# Altium footprint library Transformers.PcbLib: 102 footprints (part 4 of 7)
Each footprint in its own frame and in the unit in brackets; x right, y up, seen from the top. Pads: shape width x height; smd on the part's side, far side on the other; paste and mask are expansions set on the pad; w line width, h text height; cw(c..) or ccw(c..) is an arc to the next point about the centre after c.
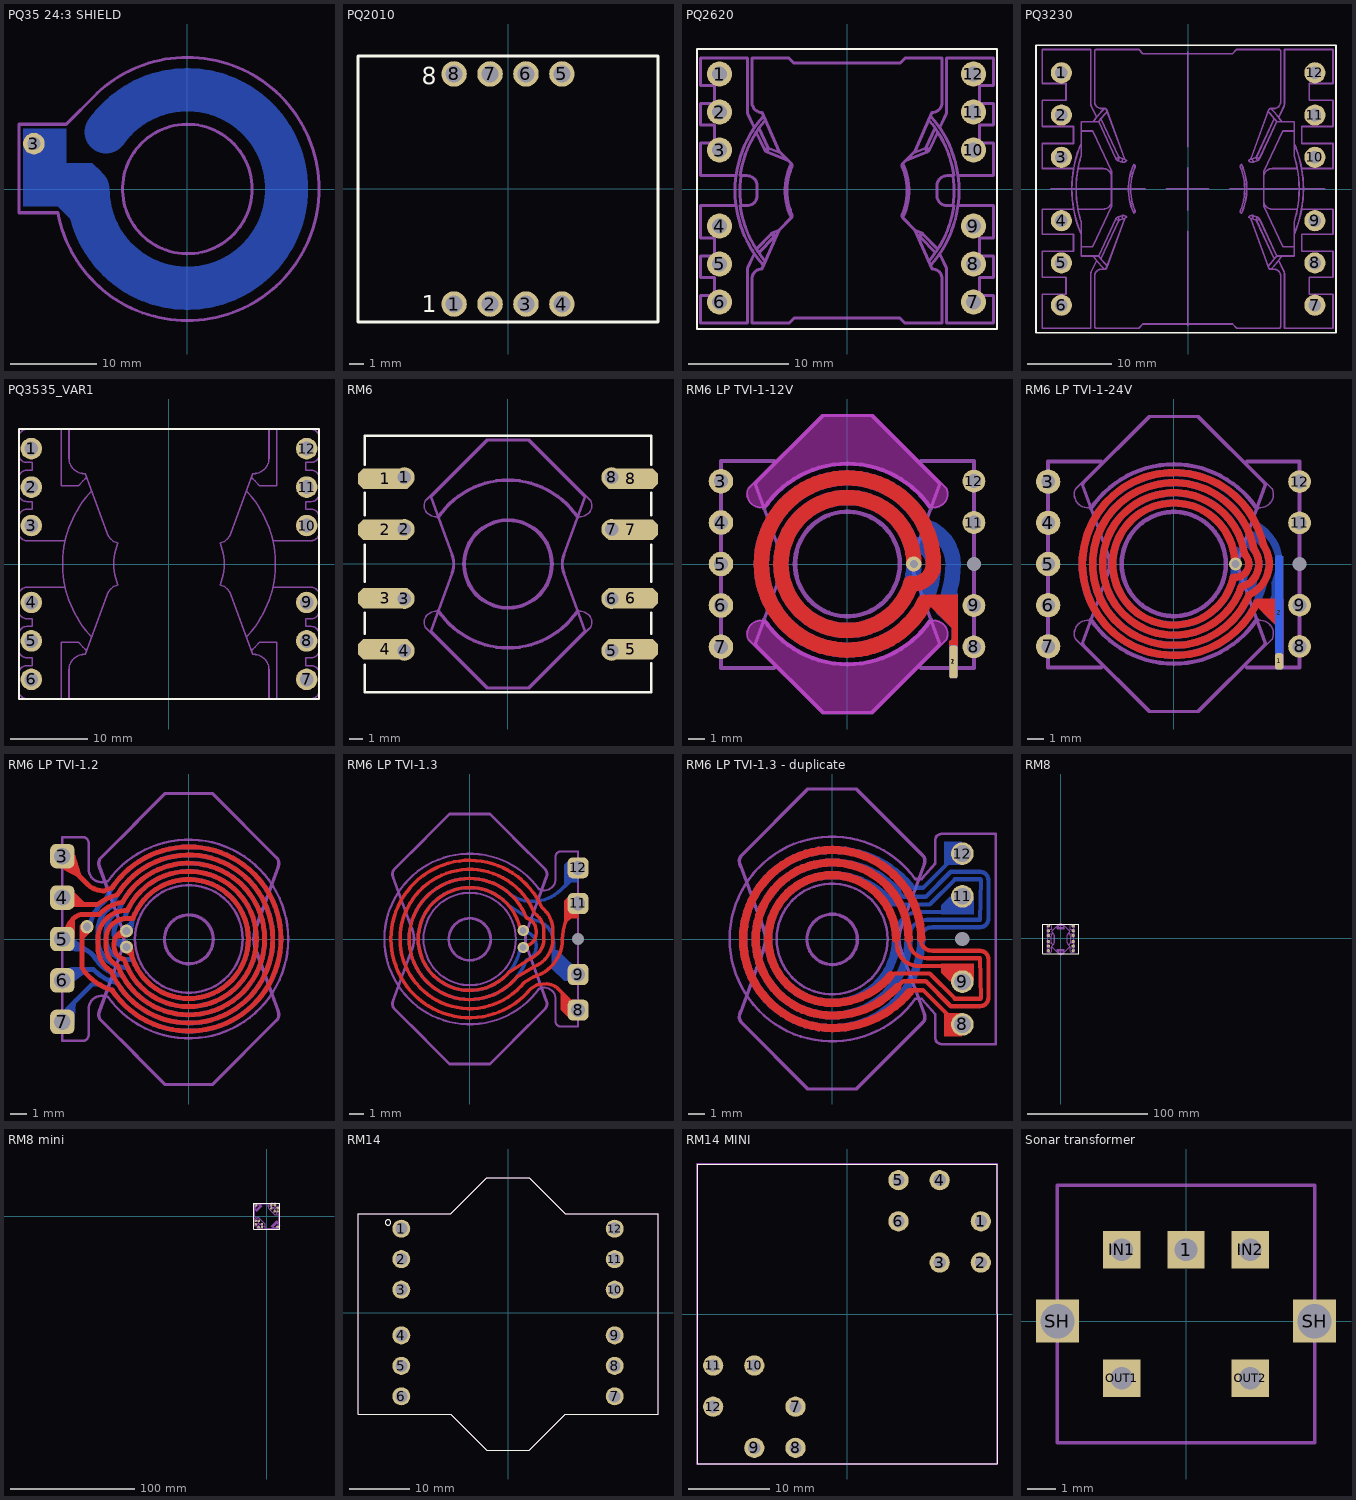
[diagram p3: the footprints below, top view; thin cyan lines are the x and y axes]

## PQ35 24:3 SHIELD [mm]
pads (1):
  round 2.5 hole 1.5: 3(-17.773,5.252)
Bottom Layer:
  region: -19,7 -19,-2 -15,-2 -10,-7 -10,-1 -10,2 -11,3 -14,3 -14,7
  lines w5: -11.5,0 ccw(c0,0) 0,-11.5 ccw(c0,0) 11.5,0 ccw(c0,0) -9.421,6.595
Mechanical 2:
  circle w0.35: c0,0 r7.5
  lines w0.35: -10.53,11 -14.03,7.5 -17,7.5 -19.5,7.5 -19.5,-2.75 -15,-2.75 ccw(c0,0) 0,-15.25 ccw(c0,0) 15.25,0 ccw(c0,0) 0,15.25 ccw(c0,0) -10.53,11.031

## PQ2010 [mm]
pads (8):
  round 1.8 hole 1.2 paste-25.4: 1(-3.81,-8.128) 2(-1.27,-8.128) 3(1.27,-8.128) 4(3.81,-8.128) 5(3.81,8.128) 6(1.27,8.128) 7(-1.27,8.128) 8(-3.81,8.128)
Top Overlay:
  lines w0.2: -10.6,-9.4 -10.6,9.4 10.6,9.4 10.6,-9.4 -10.6,-9.4
  text "1" at -6.1,-8.7 h1.2
  text "8" at -6.1,7.4 h1.2
Top Assembly:
  lines w0.1: -10.6,-9.4 -10.6,9.4 10.6,9.4 10.6,-9.4 -10.6,-9.4
  text "1" at -6.1,-8.7 h1
  text "8" at -6.1,7.4 h1
3D body "PQ2010_TRANSFORMER.step": height 9.5, standoff -2.9, extent -10.6,-9.398 10.6,9.398

## PQ2620 [mm]
pads (12):
  round 2.5 hole 1.5 paste-25.4: 1(-12.75,11.5) 2(-12.75,7.7) 3(-12.75,3.9) 4(-12.75,-3.7) 5(-12.75,-7.5) 6(-12.75,-11.3) 7(12.65,-11.3) 8(12.65,-7.5) 9(12.65,-3.7) 10(12.65,3.9) 11(12.65,7.7) 12(12.65,11.5)
Top Overlay:
  lines w0.2: -15,-14 -15,14 15,14 15,-14 -15,-14
Top Assembly:
  lines w0.3: -11.095,-1.667 -14.646,-1.667 -14.646,-4.917 -13.246,-4.917 -13.246,-6.717 -14.646,-6.717 -14.646,-8.867 -13.246,-8.867 -13.246,-10.667 -14.646,-10.667 -14.646,-13.417 -9.946,-13.417 -9.946,-8.028 cw(c-9.446,-8.028) -9.899,-7.817 -9.265,-6.455 ; -11.095,1.333 -14.646,1.333 -14.646,4.583 -13.246,4.583 -13.246,6.383 -14.646,6.383 -14.646,8.533 -13.246,8.533 -13.246,10.333 -14.646,10.333 -14.646,13.083 -9.946,13.083 -9.946,7.694 ccw(c-9.446,7.694) -9.899,7.482 -9.265,6.121 ; -10.591,-1.667 cw(c-0.043,-0.167) -10.591,1.333 ; -8.342,-7.636 cw(c0.004,-0.167) -8.342,7.302 ; -8.164,-7.233 cw(c0.004,-0.167) -8.838,-6.369 ; -8.164,6.898 ccw(c0.004,-0.167) -8.805,6.082 ; -7.037,-4.665 -7.249,-4.743 ; -6.815,-4.159 -7.386,-4.367 ; -6.582,3.569 -7.842,4.08 ; -5.856,2.843 -7.992,3.709 ; -5.57,-2.883 cw(c0.004,-0.167) -5.57,2.549 ; 5.577,-2.883 ccw(c0.004,-0.167) 5.577,2.549 ; 5.864,2.843 8,3.709 ; 6.59,3.569 7.849,4.08 ; 6.822,-4.159 7.393,-4.367 ; 7.045,-4.665 7.257,-4.743 ; 8.172,-7.233 ccw(c0.004,-0.167) 8.845,-6.369 ; 8.172,6.898 cw(c0.004,-0.167) 8.812,6.082 ; 8.349,-7.636 ccw(c0.004,-0.167) 8.349,7.302 ; 9.272,-6.455 9.907,-7.817 cw(c9.454,-8.028) 9.954,-8.028 9.954,-13.417 14.654,-13.417 14.654,-10.667 13.254,-10.667 13.254,-8.867 14.654,-8.867 14.654,-6.717 13.254,-6.717 13.254,-4.917 14.654,-4.917 14.654,-1.667 11.103,-1.667 ; 9.272,6.121 9.907,7.482 ccw(c9.454,7.694) 9.954,7.694 9.954,13.083 14.654,13.083 14.654,10.333 13.254,10.333 13.254,8.533 14.654,8.533 14.654,6.383 13.254,6.383 13.254,4.583 14.654,4.583 14.654,1.333 11.103,1.333 ; 10.598,-1.667 ccw(c0.051,-0.167) 10.598,1.333 ; -9.066,-6.03 ccw(c0.004,-0.167) -8.838,-6.369 ; -9.066,-6.03 cw(c0.004,-0.167) -10.692,-1.667 -9.996,-1.667 ccw(c-9.996,-0.667) -8.996,-0.667 -8.996,0.333 ccw(c-9.996,0.333) -9.996,1.333 -10.692,1.333 cw(c0.004,-0.167) -9.066,5.696 ; -9.066,-6.03 -7.574,-4.489 ; -9.066,5.696 cw(c0.004,-0.167) -8.805,6.082 ; -9.066,5.696 -8.257,3.961 ; -8.838,-6.369 -7.287,-4.767 ; -8.805,6.082 -7.895,4.13 ; -8.257,3.961 ccw(c-7.804,4.172) -7.992,3.709 ; -8.257,3.961 -7.895,4.13 ; -7.992,3.709 -7.842,4.08 ; -7.895,4.13 -7.873,4.1 -7.842,4.08 ; -7.574,-4.489 cw(c-7.215,-4.837) -7.386,-4.367 ; -7.574,-4.489 -7.287,-4.767 ; -7.386,-4.367 -7.249,-4.743 ; -7.287,-4.767 cw(c-7.215,-4.837) -7.249,-4.743 ; 7.257,-4.743 cw(c7.222,-4.837) 7.294,-4.767 ; 7.257,-4.743 7.393,-4.367 ; 7.294,-4.767 8.845,-6.369 ; 7.294,-4.767 7.582,-4.489 ; 7.393,-4.367 cw(c7.222,-4.837) 7.582,-4.489 ; 7.582,-4.489 9.074,-6.03 ; 7.849,4.08 8,3.709 ; 7.849,4.08 7.881,4.1 7.902,4.13 ; 7.902,4.13 8.812,6.082 ; 7.902,4.13 8.265,3.961 ; 8,3.709 ccw(c7.812,4.172) 8.265,3.961 ; 8.265,3.961 9.074,5.696 ; 8.812,6.082 cw(c0.004,-0.167) 9.074,5.696 ; 8.845,-6.369 ccw(c0.004,-0.167) 9.074,-6.03 ; 9.074,-6.03 ccw(c0.004,-0.167) 10.699,-1.667 10.004,-1.667 cw(c10.004,-0.667) 9.004,-0.667 9.004,0.333 cw(c10.004,0.333) 10.004,1.333 10.699,1.333 ccw(c0.004,-0.167) 9.074,5.696 ; -9.496,-13.417 -9.496,-8.988 cw(c-8.496,-8.988) -8.496,-7.988 -6.796,-4.117 -5.612,-2.933 ccw(c-5.895,-2.65) -5.526,-2.495 cw(c0.004,-0.167) -5.526,2.161 ccw(c-5.895,2.316) -5.612,2.599 -6.796,3.783 -8.496,7.654 cw(c-8.496,8.654) -9.496,8.654 -9.496,13.083 -5.796,13.083 -5.296,12.583 5.304,12.583 5.804,13.083 9.504,13.083 9.504,8.654 cw(c8.504,8.654) 8.504,7.654 6.804,3.783 5.62,2.599 ccw(c5.902,2.316) 5.534,2.161 cw(c0.004,-0.167) 5.534,-2.495 ccw(c5.902,-2.65) 5.62,-2.933 6.804,-4.117 8.504,-7.988 cw(c8.504,-8.988) 9.504,-8.988 9.504,-13.417 5.804,-13.417 5.304,-12.917 -5.296,-12.917 -5.796,-13.417 -9.496,-13.417
  text "1" at -12,11 h1.52
  text "12" at 11,11 h1.52
3D body "User Library-PQ 26_20.step": height 25.43, standoff -3.6, extent -14.65,-13.25 14.65,13.25

## PQ3230 [mm]
pads (12):
  round 2.5 hole 1.5 paste-25.4: 1(-15,13.75) 2(-15,8.75) 3(-15,3.75) 4(-15,-3.75) 5(-15,-8.75) 6(-15,-13.75) 7(15,-13.75) 8(15,-8.75) 9(15,-3.75) 10(15,3.75) 11(15,8.75) 12(15,13.75)
Top Overlay:
  lines w0.2: -18,-17 -18,17 17.5,17 17.5,-16.5 17.5,-17 -18,-17
Top Assembly:
  drawing of 220 lines, arcs and shapes, not listed
3D body "User Library-PQ 32_30.step": height 35.9, standoff -1.9, extent -17.2,-16.5 17.2,16.5

## PQ3535_VAR1 [mm]
pads (12):
  round 2.8 hole 1.8: 1(-17.9,15) 2(-17.9,10) 3(-17.9,5) 4(-17.9,-5) 5(-17.9,-10) 6(-17.9,-15) 7(17.9,-15) 8(17.9,-10) 9(17.9,-5) 10(17.9,5) 11(17.9,10) 12(17.9,15)
Top Overlay:
  lines w0.2: -19.5,-17.55 19.5,-17.55 19.5,17.55 -19.5,17.55 -19.5,-17.55
Top Assembly:
  lines w0.2: -13.5,-3.04 -18.5,-3.04 ccw(c-18.5,-4.04) -19.5,-4.04 -19.5,-6.12 ccw(c-18.5,-6.12) -18.5,-7.12 -17.78,-7.12 -17.78,-8.12 -18.5,-8.12 ccw(c-18.5,-9.12) -19.5,-9.12 -19.5,-11.2 ccw(c-18.5,-11.2) -18.5,-12.2 -17.78,-12.2 -17.78,-13.2 -18.5,-13.2 ccw(c-18.5,-14.2) -19.5,-14.2 -19.5,-16.5 ccw(c-18.5,-16.5) -18.5,-17.5 -14,-17.5 -14,-10.16 -11.772,-10.16 -11.191,-10.796 -10.693,-11.29 ; -13.5,3.04 -18.5,3.04 cw(c-18.5,4.04) -19.5,4.04 -19.5,6.12 cw(c-18.5,6.12) -18.5,7.12 -17.78,7.12 -17.78,8.12 -18.5,8.12 cw(c-18.5,9.12) -19.5,9.12 -19.5,11.2 cw(c-18.5,11.2) -18.5,12.2 -17.78,12.2 -17.78,13.2 -18.5,13.2 cw(c-18.5,14.2) -19.5,14.2 -19.5,16.5 cw(c-18.5,16.5) -18.5,17.5 -14,17.5 -14,10.16 -11.772,10.16 -11.191,10.796 -10.693,11.29 ; -10.047,-9.516 cw(c0,0) -10.047,9.516 ; 10.047,-9.516 ccw(c0,0) 10.047,9.516 ; 10.693,-11.29 11.191,-10.796 11.772,-10.16 14,-10.16 14,-17.5 18.5,-17.5 ccw(c18.5,-16.5) 19.5,-16.5 19.5,-14.2 ccw(c18.5,-14.2) 18.5,-13.2 17.78,-13.2 17.78,-12.2 18.5,-12.2 ccw(c18.5,-11.2) 19.5,-11.2 19.5,-9.12 ccw(c18.5,-9.12) 18.5,-8.12 17.78,-8.12 17.78,-7.12 18.5,-7.12 ccw(c18.5,-6.12) 19.5,-6.12 19.5,-4.04 ccw(c18.5,-4.04) 18.5,-3.04 13.5,-3.04 ; 10.693,11.29 11.191,10.796 11.772,10.16 14,10.16 14,17.5 18.5,17.5 cw(c18.5,16.5) 19.5,16.5 19.5,14.2 cw(c18.5,14.2) 18.5,13.2 17.78,13.2 17.78,12.2 18.5,12.2 cw(c18.5,11.2) 19.5,11.2 19.5,9.12 cw(c18.5,9.12) 18.5,8.12 17.78,8.12 17.78,7.12 18.5,7.12 cw(c18.5,6.12) 19.5,6.12 19.5,4.04 cw(c18.5,4.04) 18.5,3.04 13.5,3.04 ; -13,-17.55 13,-17.55 13,-13.75 ccw(c11,-13.75) 11,-11.75 10.86,-11.75 8.032,-3.981 ccw(c6.153,-4.665) 6.907,-2.813 6.645,-2.706 ccw(c0,0) 6.645,2.706 6.907,2.813 ccw(c6.153,4.665) 8.032,3.981 10.86,11.75 11,11.75 ccw(c11,13.75) 13,13.75 13,17.55 -13,17.55 -13,13.75 ccw(c-11,13.75) -11,11.75 -10.86,11.75 -8.032,3.981 ccw(c-6.153,4.665) -6.907,2.813 -6.645,2.706 ccw(c0,0) -6.645,-2.706 -6.907,-2.813 ccw(c-6.153,-4.665) -8.032,-3.981 -10.86,-11.75 -11,-11.75 ccw(c-11,-13.75) -13,-13.75 -13,-17.55
  text "1" at -15.5,13.596 h1
  text "6" at -15.5,-15 h1
  text "7" at 15,-15 h1
  text "12" at 14.5,13.596 h1
3D body "User Library-PQ3535(6+6).STEP": height 38.05, standoff -3.7, extent -19.5,-17.75 19.5,17.75

## RM6 [mm]
pads (16):
  oct 4x1.5 smd: 1(-9,6.25) 2(-9,2.5) 3(-9,-2.5) 4(-9,-6.25) 5(9,-6.25) 6(9,-2.5) 7(9,2.5) 8(9,6.25)
  round 1.5 hole 1: 1(-7.6,6.35) 2(-7.6,2.54) 3(-7.6,-2.54) 4(-7.6,-6.35) 5(7.6,-6.35) 6(7.6,-2.54) 7(7.6,2.54) 8(7.6,6.35)
Top Overlay:
  lines w0.2: -10.5,-7.4 -10.5,-9.4 10.5,-9.4 10.5,-7.3 ; -10.5,-5.1 -10.5,-3.6 ; -10.5,-1.3 -10.5,1.4 ; -10.5,3.6 -10.5,5.2 ; -10.5,7.3 -10.5,9.4 10.5,9.4 10.5,7.3 ; 10.5,-5.1 10.5,-3.6 ; 10.5,-1.3 10.5,1.4 ; 10.5,3.6 10.5,5.2
Mechanical 2:
  circle w0.102: c0,0 r3.302
  lines w0.102: -6.057,-4.651 cw(c-5.329,-4.289) -4.978,-3.556 ; -6.057,4.651 ccw(c-5.329,4.289) -4.978,3.556 ; -6.05,-4.643 -1.549,-9.144 1.549,-9.144 6.05,-4.643 ; -6.05,4.643 -1.549,9.144 1.549,9.144 6.05,4.643 ; -5.931,4.763 -1.57,9.124 ; -4.96,-3.543 ccw(c0,0) 4.961,-3.543 ; -4.961,3.543 cw(c0,0) 4.961,3.543 ; 1.57,-9.124 5.931,-4.763 ; 4.978,-3.556 cw(c5.329,-4.289) 6.057,-4.651 ; 4.978,3.556 ccw(c5.329,4.289) 6.057,4.651
Top Assembly:
  circle w0.254: c0,0 r3.2
  lines w0.2: -5.635,-4.871 -4.103,-0.661 ; -5.577,-4.996 -1.486,-9.086 ; -1.486,-9.1 1.486,-9.1 ; -1.486,9.086 -5.577,4.996 -5.635,4.871 -4.103,0.661 ; -1.486,9.1 1.486,9.1 ; 1.486,-9.086 5.577,-4.996 ; 1.486,9.086 5.577,4.996 ; -4.103,-0.707 ccw(c-5.982,-0.023) -4.103,0.661 ; -4.103,-0.707 ccw(c-5.982,-0.023) -4.103,0.661 ; -4.103,-0.707 ccw(c-5.982,-0.023) -4.103,0.661 ; -4.103,-0.707 ccw(c-5.982,-0.023) -4.103,0.661 ; -4.103,-0.661 ccw(c-5.982,0.023) -4.103,0.707 ; -4.103,-0.661 ccw(c-5.982,0.023) -4.103,0.707 ; -4.103,-0.661 ccw(c-5.982,0.023) -4.103,0.707 ; -4.103,-0.661 ccw(c-5.982,0.023) -4.103,0.707 ; 4.103,-0.707 cw(c5.982,-0.023) 4.103,0.661 ; 4.103,-0.707 cw(c5.982,-0.023) 4.103,0.661 ; 4.103,-0.707 cw(c5.982,-0.023) 4.103,0.661 ; 4.103,-0.707 cw(c5.982,-0.023) 4.103,0.661 ; 4.103,-0.661 cw(c5.982,0.023) 4.103,0.707 ; 4.103,-0.661 cw(c5.982,0.023) 4.103,0.707 ; 4.103,-0.661 cw(c5.982,0.023) 4.103,0.707 ; 4.103,-0.661 cw(c5.982,0.023) 4.103,0.707 ; 4.103,-0.661 5.635,-4.871 ; 4.103,-0.661 5.49,-4.471 4.103,-0.661 ; 4.103,0.661 5.49,4.471 4.103,0.661 ; 4.103,0.661 5.635,4.871 ; 5.577,-4.996 5.635,-4.871 ; 5.577,-4.996 5.635,-4.871 ; 5.577,4.996 5.635,4.871 ; 5.577,4.996 5.635,4.871
  lines w0.254: -5.117,-3.411 ccw(c0,0) 5.117,-3.412 ; -5.117,3.411 cw(c0,0) 5.117,3.412
3D body "RM6.STEP": height 13.13, standoff 0, extent -10.5,-9.406 10.5,9.406

## RM6 LP TVI-1-12V [mm]
pads (12):
  rrect50% 0.5x2 smd: 1(6.5,-6)
  rrect50% 0.5x2 smd far side: 2(6.5,-6)
  round 1.5 hole 0.85: 3(-7.75,5.08) 4(-7.75,2.54) 5(-7.75,0) 6(-7.75,-2.54) 7(-7.75,-5.08)
  round 1.4 hole 0.85: 8(7.75,-5.08) 9(7.75,-2.54) 11(7.75,2.54) 12(7.75,5.08)
  round 0 hole 0.85: 10(7.75,0)
via 4.075,0 diameter 0.95 hole 0.5
Top Layer:
  region: 6.4,-3.9 4.65,-2.15 4.9,-1.9 6.75,-1.9 6.75,-3 6.75,-3.7 6.75,-4.5 6.75,-5.4 6.5,-5.4 6.25,-5.5 6.25,-4.75 6.4,-4.6
  lines w0.254: 4.75,-2.25 5.293,-2.25 cw(c5.293,-3.957) 6.5,-2.75 6.5,-6
  lines w0.95: 3.898,-1.188 cw(c0,0) -4.075,0 cw(c0,0) 0,4.075 cw(c0,0) 4.075,0 ; 3.898,-1.187 ccw(c4.075,0) 5.275,0 ccw(c0,0) 0,5.275 ccw(c0,0) -5.275,0 ccw(c0,0) 4.718,-2.359
Bottom Layer:
  region: 6.25,-3.8 5.475,-3.025 6.75,-1.75 6.75,-5.5 6.25,-5.5 6.25,-4.75 6.4,-4.6 6.4,-3.95
  lines w0.95: 3.898,1.187 cw(c4.075,0) 5.275,0 cw(c0,0) 0,-5.275 cw(c0,0) -5.275,0 cw(c0,0) 4.718,2.359 ; 3.898,1.188 ccw(c0,0) -4.075,0 ccw(c0,0) 0,-4.075 ccw(c0,0) 4.075,0 ; 4.713,2.314 cw(c4.075,0) 6.475,0 cw(c0,0) 5.85,-2.776
Keep-Out Layer:
  drawing of 2 lines, arcs and shapes, not listed
Mechanical 2:
  circle w0.102: c0,0 r3.302
  lines w0.102: -6.057,-4.651 cw(c-5.329,-4.289) -4.978,-3.556 ; -6.057,4.651 ccw(c-5.329,4.289) -4.978,3.556 ; -6.05,-4.643 -1.549,-9.144 1.549,-9.144 6.05,-4.643 ; -6.05,4.643 -1.549,9.144 1.549,9.144 6.05,4.643 ; -5.931,4.763 -1.57,9.124 ; -4.96,-3.543 ccw(c0,0) 4.961,-3.543 ; -4.961,3.543 cw(c0,0) 4.96,3.543 ; 1.57,-9.124 5.931,-4.763 ; 4.978,-3.556 cw(c5.329,-4.289) 6.057,-4.651 ; 4.978,3.556 ccw(c5.329,4.289) 6.057,4.651
Top Assembly:
  circle w0.254: c0,0 r3.2
  lines w0.2: -1.486,-9.1 1.486,-9.1 ; -1.486,-9.086 -5.577,-4.996 -5.635,-4.871 -4.103,-0.661 ; -1.486,9.086 -5.577,4.996 -5.635,4.871 -4.103,0.661 ; -1.486,9.1 1.486,9.1 ; 1.486,-9.086 5.577,-4.996 ; 1.486,9.086 5.577,4.996 ; -4.103,-0.707 ccw(c-5.982,-0.023) -4.103,0.661 ; -4.103,-0.707 ccw(c-5.982,-0.023) -4.103,0.661 ; -4.103,-0.707 ccw(c-5.982,-0.023) -4.103,0.661 ; -4.103,-0.707 ccw(c-5.982,-0.023) -4.103,0.661 ; -4.103,-0.661 ccw(c-5.982,0.023) -4.103,0.707 ; -4.103,-0.661 ccw(c-5.982,0.023) -4.103,0.707 ; -4.103,-0.661 ccw(c-5.982,0.023) -4.103,0.707 ; -4.103,-0.661 ccw(c-5.982,0.023) -4.103,0.707 ; 4.103,-0.707 cw(c5.982,-0.023) 4.103,0.661 ; 4.103,-0.707 cw(c5.982,-0.023) 4.103,0.661 ; 4.103,-0.707 cw(c5.982,-0.023) 4.103,0.661 ; 4.103,-0.707 cw(c5.982,-0.023) 4.103,0.661 ; 4.103,-0.661 cw(c5.982,0.023) 4.103,0.707 ; 4.103,-0.661 cw(c5.982,0.023) 4.103,0.707 ; 4.103,-0.661 cw(c5.982,0.023) 4.103,0.707 ; 4.103,-0.661 cw(c5.982,0.023) 4.103,0.707 ; 4.103,-0.661 5.49,-4.471 4.103,-0.661 ; 4.103,-0.661 5.635,-4.871 ; 4.103,0.661 5.635,4.871 ; 4.103,0.661 5.49,4.471 4.103,0.661 ; 5.577,-4.996 5.635,-4.871 ; 5.577,-4.996 5.635,-4.871 ; 5.577,4.996 5.635,4.871 ; 5.577,4.996 5.635,4.871
  lines w0.25: -4.5,-6.375 -7.75,-6.375 -7.75,6.323 -4.5,6.323 ; 4.5,-6.375 7.75,-6.375 7.75,6.323 4.5,6.323
  lines w0.254: -5.117,-3.411 ccw(c0,0) 5.117,-3.412 ; -5.117,3.411 cw(c0,0) 5.117,3.412
3D body "User Library-rm_6.step": height 4, standoff -0.5, extent -5.235,-8.9 5.235,9
3D body "User Library-rm_6.step": height 4, standoff -0.5, extent -5.235,-8.9 5.235,9

## RM6 LP TVI-1-24V [mm]
pads (12):
  rrect50% 0.5x1 smd: 1(6.5,-6)
  rrect50% 0.5x7 smd far side: 2(6.5,-3)
  round 1.5 hole 0.85: 3(-7.75,5.08) 4(-7.75,2.54) 5(-7.75,0) 6(-7.75,-2.54) 7(-7.75,-5.08)
  round 1.4 hole 0.85: 8(7.75,-5.08) 9(7.75,-2.54) 11(7.75,2.54) 12(7.75,5.08)
  round 0 hole 0.85: 10(7.75,0)
via 3.8,0 diameter 0.8 hole 0.5
Top Layer:
  region: 605 vertices and 0 holes, not listed, extent -5.85,-5.853 6.088,5.85
  region: 6.4,-3.9 4.888,-2.387 5.125,-2.15 6.75,-2.15 6.75,-3 6.75,-3.7 6.75,-4.5 6.75,-6 6.25,-6 6.25,-4.75 6.4,-4.6
Bottom Layer:
  region: 576 vertices and 0 holes, not listed, extent -5.85,-5.85 6.713,5.852
  region: 5.492,-2.992 6.025,-1.951 6.025,-1.15 6.3,-1.15 6.3,-3.8
Mechanical 2:
  circle w0.102: c0,0 r3.302
  lines w0.102: -6.057,-4.651 cw(c-5.329,-4.289) -4.978,-3.556 ; -6.057,4.651 ccw(c-5.329,4.289) -4.978,3.556 ; -6.05,-4.643 -1.549,-9.144 1.549,-9.144 6.05,-4.643 ; -6.05,4.643 -1.549,9.144 1.549,9.144 6.05,4.643 ; -5.931,4.763 -1.57,9.124 ; -4.96,-3.543 ccw(c0,0) 4.961,-3.543 ; -4.961,3.543 cw(c0,0) 4.96,3.543 ; 1.57,-9.124 5.931,-4.763 ; 4.978,-3.556 cw(c5.329,-4.289) 6.057,-4.651 ; 4.978,3.556 ccw(c5.329,4.289) 6.057,4.651
Top Assembly:
  circle w0.254: c0,0 r3.2
  lines w0.2: -1.486,-9.1 1.486,-9.1 ; -1.486,-9.086 -5.577,-4.996 -5.635,-4.871 -4.103,-0.661 ; -1.486,9.086 -5.577,4.996 -5.635,4.871 -4.103,0.661 ; -1.486,9.1 1.486,9.1 ; 1.486,-9.086 5.577,-4.996 ; 1.486,9.086 5.577,4.996 ; -4.103,-0.707 ccw(c-5.982,-0.023) -4.103,0.661 ; -4.103,-0.707 ccw(c-5.982,-0.023) -4.103,0.661 ; -4.103,-0.707 ccw(c-5.982,-0.023) -4.103,0.661 ; -4.103,-0.707 ccw(c-5.982,-0.023) -4.103,0.661 ; -4.103,-0.661 ccw(c-5.982,0.023) -4.103,0.707 ; -4.103,-0.661 ccw(c-5.982,0.023) -4.103,0.707 ; -4.103,-0.661 ccw(c-5.982,0.023) -4.103,0.707 ; -4.103,-0.661 ccw(c-5.982,0.023) -4.103,0.707 ; 4.103,-0.707 cw(c5.982,-0.023) 4.103,0.661 ; 4.103,-0.707 cw(c5.982,-0.023) 4.103,0.661 ; 4.103,-0.707 cw(c5.982,-0.023) 4.103,0.661 ; 4.103,-0.707 cw(c5.982,-0.023) 4.103,0.661 ; 4.103,-0.661 cw(c5.982,0.023) 4.103,0.707 ; 4.103,-0.661 cw(c5.982,0.023) 4.103,0.707 ; 4.103,-0.661 cw(c5.982,0.023) 4.103,0.707 ; 4.103,-0.661 cw(c5.982,0.023) 4.103,0.707 ; 4.103,-0.661 5.49,-4.471 4.103,-0.661 ; 4.103,-0.661 5.635,-4.871 ; 4.103,0.661 5.635,4.871 ; 4.103,0.661 5.49,4.471 4.103,0.661 ; 5.577,-4.996 5.635,-4.871 ; 5.577,-4.996 5.635,-4.871 ; 5.577,4.996 5.635,4.871 ; 5.577,4.996 5.635,4.871
  lines w0.25: -4.5,-6.375 -7.75,-6.375 -7.75,6.323 -4.5,6.323 ; 4.5,-6.375 7.75,-6.375 7.75,6.323 4.5,6.323
  lines w0.254: -5.117,-3.411 ccw(c0,0) 5.117,-3.412 ; -5.117,3.411 cw(c0,0) 5.117,3.412
3D body "User Library-rm_6.step": height 4, standoff -0.5, extent -5.235,-8.9 5.235,9
3D body "User Library-rm_6.step": height 4, standoff -0.5, extent -5.235,-8.9 5.235,9

## RM6 LP TVI-1.2 [mm]
pads (5):
  rrect50% 1.5x1.5 hole 1: 3(-7.75,5.08) 4(-7.75,2.54) 5(-7.75,0) 6(-7.75,-2.54) 7(-7.75,-5.08)
via -3.825,-0.5 diameter 0.8 hole 0.5
via -3.825,0.5 diameter 0.8 hole 0.5
via -3.825,-0.5 diameter 0.8 hole 0.5
via -6.25,0.75 diameter 0.8 hole 0.5
Top Layer:
  region: -7.245,-0.293 -7,0.044 -7,1.455 -7.377,1.077 -7.965,-0.013
  region: -7.8,1.97 -6.425,1.97 -6.225,2.07 -7.215,3.06
  region: -7.8,4.3 -6.619,3.693 -6.619,4 -7,5.2
  region: -3.85,-0.9 -3.65,-1.025 -3.35,-1.025 -3.475,-0.3
  region: -4.225,0.525 -4.45,0.165 -4.45,0.008 -3.625,0.15
  region: -6.7,-0.225 -6.087,0.387 -6.612,0.912 -6.7,0.825
  lines w0.3: -7.8,4.95 -6.193,3.343 ccw(c-5.254,4.282) -5.254,2.954 -5.179,2.954 cw(c-3.825,0) -4.711,3.127 ; -7.75,2.54 -7.318,2.108 -5.591,2.108 cw(c-3.825,0) -4.392,2.691 ; -7.75,5.08 cw(c-7.75,4.67) -7.46,4.96 ; -7.3,0.7 cw(c-6.499,0.7) -6.499,1.501 -5.501,1.501 cw(c-3.825,0) -4.073,2.236 ; -6.557,-1.761 ccw(c-3.825,0) -4.689,-3.133 ; -6.55,-1.761 -6.55,0.45 ; -4.78,-1.966 cw(c-3.825,-0.5) -5.575,-0.5 -5.575,0 cw(c-3.825,0) -3.947,1.746 -3.761,1.746 ; -4.744,-2.003 ccw(c0,0) 0,-5.15 ccw(c0,0) 5.15,0 ccw(c0,0) -4.392,2.689 ; -4.693,3.146 cw(c0,0) 0,5.65 cw(c0,0) 5.65,0 cw(c0,0) -4.693,-3.146 ; -4.365,-1.627 cw(c-3.825,-0.5) -5.075,-0.5 -5.075,0 cw(c-3.825,0) -3.91,1.247 -3.44,1.247 ; -4.357,-1.624 ccw(c0,0) 0,-4.65 ccw(c0,0) 4.65,0 ccw(c0,0) -4.076,2.238 ; -3.997,-1.23 cw(c-3.825,-0.5) -4.575,-0.5 -4.575,-0.25 cw(c-3.825,-0.25) -3.825,0.5 ; -3.959,-1.243 ccw(c0,0) 0,-4.15 ccw(c0,0) 4.15,0 ccw(c0,0) -3.761,1.754 ; -3.584,-0.689 ccw(c0,0) 0,-3.65 ccw(c0,0) 3.65,0 ccw(c0,0) -3.428,1.255 ; -6.55,0.45 cw(c-6.25,0.45) -6.25,0.75 -6.55,0.45
Mid-Layer 14:
  lines w0.15: -7.75,-5.58 ccw(c-7.75,-5.08) -7.75,-4.58 ; -7.75,-3.04 ccw(c-7.75,-2.54) -7.75,-2.04 ; -7.75,2.04 ccw(c-7.75,2.54) -7.75,3.04 ; -7.75,4.58 ccw(c-7.75,5.08) -7.75,5.58
Bottom Layer:
  region: -7.75,-1.94 -6.35,-1.84 -6.15,-1.94 -7.75,-3.14
  region: -7.7,-0.7 -6.3,-0.8 -6.1,-0.7 -7.7,0.5
  region: -4.225,-0.525 -4.45,-0.165 -4.45,-0.008 -3.625,-0.15
  region: -3.85,0.9 -3.65,1.025 -3.35,1.025 -3.475,0.3
  region: -7.025,-5.275 -6.925,-3.875 -7.025,-3.675 -8.225,-5.275
  lines w0.3: -7.75,-2.54 cw(c-7.071,-2.54) -7.071,-1.861 -5.849,-1.861 ccw(c-3.825,0) -4.392,-2.691 ; -7.75,-0.25 -7.722,-0.25 cw(c-7.722,-2.938) -5.822,-1.037 ccw(c-3.825,0) -4.073,-2.236 ; -7.46,-4.96 cw(c-7.75,-4.67) -7.75,-5.08 cw(c-6.618,-5.08) -7.419,-4.28 -6.046,-2.907 -5.914,-2.776 -5.516,-2.776 ccw(c-3.825,0) -4.715,-3.126 ; -6.063,0.731 cw(c-3.825,0.5) -5.218,2.267 ; -5.15,2.323 cw(c0,0) 5.65,0 cw(c0,0) 0,-5.65 cw(c0,0) -4.709,-3.122 ; -4.78,1.966 ccw(c-3.825,0.5) -5.575,0.5 -5.575,0 ccw(c-3.825,0) -3.947,-1.746 -3.761,-1.746 ; -4.744,2.003 cw(c0,0) 0,5.15 cw(c0,0) 5.15,0 cw(c0,0) -4.392,-2.689 ; -4.365,1.627 ccw(c-3.825,0.5) -5.075,0.5 -5.075,0 ccw(c-3.825,0) -3.91,-1.247 -3.44,-1.247 ; -4.357,1.624 cw(c0,0) 0,4.65 cw(c0,0) 4.65,0 cw(c0,0) -4.076,-2.238 ; -3.997,1.23 ccw(c-3.825,0.5) -4.575,0.5 -4.575,0.25 ccw(c-3.825,0.25) -3.825,-0.5 ; -3.959,1.243 cw(c0,0) 0,4.15 cw(c0,0) 4.15,0 cw(c0,0) -3.761,-1.754 ; -3.584,0.689 cw(c0,0) 0,3.65 cw(c0,0) 3.65,0 cw(c0,0) -3.428,-1.255
Mechanical 2:
  circle w0.15: c0,0 r3.302
  lines w0.15: -4.978,-3.556 ccw(c-5.329,-4.289) -6.141,-4.301 -6.141,-5.706 -6.141,-5.891 cw(c-6.5,-5.891) -6.5,-6.25 -7.75,-6.25 -7.75,6.25 ; -4.978,3.556 cw(c-5.329,4.289) -6.141,4.301 -6.141,5.706 -6.141,5.891 ccw(c-6.5,5.891) -6.5,6.25 -7.541,6.25 -7.75,6.25 ; -4.961,-3.543 ccw(c0,0) 6.096,0 ccw(c0,0) -4.961,3.543 ; -7.75,6.25 ccw(c-7.75,6.25) -7.75,6.25 ; -7.75,6.25 ccw(c-7.75,6.25) -7.75,6.25 ; -7.75,6.25 -7.75,6.25
Top Assembly:
  circle w0.2: c0.002,-0.023 r1.5
  lines w0.2: -5.434,-4.308 -5.493,-4.471 ccw(c-5.023,-4.642) -5.377,-4.996 -1.446,-8.927 1.446,-8.927 5.377,-4.996 ccw(c5.023,-4.642) 5.493,-4.471 5.434,-4.308 ; -5.434,4.308 -5.493,4.471 cw(c-5.023,4.642) -5.377,4.996 -1.446,8.927 1.446,8.927 5.377,4.996 cw(c5.023,4.642) 5.493,4.471 5.434,4.308 ; -4.103,-0.707 ccw(c-5.982,-0.023) -4.103,0.661 -5.49,4.471 cw(c-5.02,4.642) -5.373,4.996 -3.14,7.23 ; -4.103,0.707 cw(c-5.982,0.023) -4.103,-0.661 -5.49,-4.471 ccw(c-5.02,-4.642) -5.373,-4.996 -3.14,-7.23 ; 0,1.477 cw(c-0.002,-0.023) 1.498,-0.023 ; 3.14,-7.23 5.373,-4.996 ccw(c5.02,-4.642) 5.49,-4.471 4.103,-0.661 cw(c5.982,0.023) 4.103,0.707 ; 3.14,7.23 5.373,4.996 cw(c5.02,4.642) 5.49,4.471 4.103,0.661 ccw(c5.982,-0.023) 4.103,-0.707

## RM6 LP TVI-1.3 [mm]
pads (5):
  rrect50% 1.5x1.5 hole 1: 8(7.75,-5.08) 9(7.75,-2.54) 11(7.75,2.54) 12(7.75,5.08)
  round 0 hole 0.85: 10(7.75,0)
via 3.825,-0.6 diameter 0.8 hole 0.5
via 3.825,0.6 diameter 0.8 hole 0.5
Top Layer:
  region: 6.525,-5.065 7.25,-5.79 7.75,-5.29 7.75,-4.325 7.25,-4.325 6.525,-3.6
  region: 6.75,2.75 7.25,3.25 7.75,2.75 7.75,1.5 7.25,1.5 6.875,1.125 6.75,1.25
  lines w0.25: 3.638,0.52 ccw(c0,0) 0,3.675 ccw(c0,0) -3.675,0 ccw(c0,0) 2.831,-2.343 4.353,-1.377 ccw(c3.825,0) 5.3,0 5.3,0.6 ccw(c3.825,0.6) 4.623,1.841 ; 4.045,-0.499 ccw(c3.825,0.4) 4.75,0.4 4.75,0.6 ccw(c3.825,0.6) 4.064,1.493 ; 4.05,1.519 ccw(c0,0) 0,4.325 ccw(c0,0) -4.325,0 ccw(c0,0) 3.377,-2.702 4.586,-1.984 ccw(c3.825,0) 5.95,0 5.95,0.6 ccw(c3.825,0.6) 5.146,2.264 ; 4.6,-2.691 ccw(c3.825,0) 6.625,0 cw(c10.041,0) 7.626,2.416 7.75,2.54 ; 4.6,-2.69 3.873,-3.121 cw(c0,0) -4.975,0 cw(c0,0) 4.623,1.838 ; 5.149,2.265 ccw(c0,0) -5.625,0 ccw(c0,0) 4.371,-3.54 4.852,-3.254 5.5,-3.204 cw(c5.5,-4.3) 6.275,-3.525 ; 6.25,-3.5 7.693,-4.943 cw(c7.557,-5.08) 7.75,-5.08
Mid-Layer 14:
  lines w0.15: 7.75,-5.58 cw(c7.75,-5.08) 7.75,-4.58 ; 7.75,-3.04 cw(c7.75,-2.54) 7.75,-2.04 ; 7.75,2.04 cw(c7.75,2.54) 7.75,3.04 ; 7.75,4.58 cw(c7.75,5.08) 7.75,5.58
Bottom Layer:
  region: 6.29,-0.79 8,-2.5 7.5,-3 6.75,-3 5.875,-2.125 5.875,-0.79
  region: 6.75,5.29 7.25,5.79 7.75,5.29 7.75,4.04 7.25,4.04 6.875,3.665 6.75,3.79
  lines w0.25: 3.638,-0.52 cw(c0,0) 0,-3.675 cw(c0,0) -3.675,0 cw(c0,0) 2.831,2.343 4.353,1.377 cw(c4.353,-0.27) 6,-0.27 6,-0.79 ccw(c7.75,-0.79) 7.75,-2.54 ; 4.045,0.499 cw(c3.825,-0.4) 4.75,-0.4 4.75,-0.6 cw(c3.825,-0.6) 4.064,-1.493 ; 4.05,-1.519 cw(c0,0) 0,-4.325 cw(c0,0) -4.325,0 cw(c0,0) 2.637,3.428 ccw(c4.39,5.182) 4.39,2.702 4.573,2.702 ccw(c4.573,5.427) 6.5,3.5 7.517,4.517 ccw(c6.953,5.08) 7.75,5.08
Mechanical 2:
  circle w0.15: c0,0 r3.302
  lines w0.15: 4.961,-3.543 cw(c0,0) -6.096,0 cw(c0,0) 4.961,3.543 ; 4.978,-3.556 cw(c5.329,-4.289) 6.141,-4.301 6.141,-5.706 6.141,-5.891 ccw(c6.5,-5.891) 6.5,-6.25 7.75,-6.25 7.75,6.25 ; 4.978,3.556 ccw(c5.329,4.289) 6.141,4.301 6.141,5.706 6.141,5.891 cw(c6.5,5.891) 6.5,6.25 7.541,6.25 7.75,6.25 ; 7.75,6.25 ccw(c7.75,6.25) 7.75,6.25 ; 7.75,6.25 ccw(c7.75,6.25) 7.75,6.25 ; 7.75,6.25 7.75,6.25
Top Assembly:
  circle w0.2: c0.002,-0.023 r1.5
  lines w0.2: -5.434,-4.308 -5.493,-4.471 ccw(c-5.023,-4.642) -5.377,-4.996 -1.446,-8.927 1.446,-8.927 5.377,-4.996 ccw(c5.023,-4.642) 5.493,-4.471 5.434,-4.308 ; -5.434,4.308 -5.493,4.471 cw(c-5.023,4.642) -5.377,4.996 -1.446,8.927 1.446,8.927 5.377,4.996 cw(c5.023,4.642) 5.493,4.471 5.434,4.308 ; -4.103,-0.707 ccw(c-5.982,-0.023) -4.103,0.661 -5.49,4.471 cw(c-5.02,4.642) -5.373,4.996 -3.14,7.23 ; -4.103,0.707 cw(c-5.982,0.023) -4.103,-0.661 -5.49,-4.471 ccw(c-5.02,-4.642) -5.373,-4.996 -3.14,-7.23 ; 0,1.477 cw(c-0.002,-0.023) 1.498,-0.023 ; 3.14,-7.23 5.373,-4.996 ccw(c5.02,-4.642) 5.49,-4.471 4.103,-0.661 cw(c5.982,0.023) 4.103,0.707 ; 3.14,7.23 5.373,4.996 cw(c5.02,4.642) 5.49,4.471 4.103,0.661 ccw(c5.982,-0.023) 4.103,-0.707

## RM6 LP TVI-1.3 - duplicate [mm]
pads (5):
  round 1.35 hole 1: 8(7.75,-5.08) 9(7.75,-2.54) 11(7.75,2.54) 12(7.75,5.08)
  round 0 hole 0.85: 10(7.75,0)
Top Layer:
  region: 7.71,-5.775 7.71,-4.405 6.685,-4.405 6.685,-5.775
  region: 6.5,-2 7,-2.5 8.425,-2.5 8.425,-1.475 6.5,-1.475
  lines w0.25: 3.7,-2.059 5.809,-2.059 7.3,-3.55 8.825,-3.55 ; 3.858,-0.066 3.858,-0.33 ccw(c5.128,-0.33) 5.128,-1.6 6.6,-1.6 6.808,-1.6 cw(c6.808,-1.998) 7.206,-1.998 7.75,-2.54 ; 3.867,-2.875 4.232,-2.509 5.569,-2.509 7.059,-4 8.8,-4 ccw(c8.8,-3.5) 9.3,-3.5 9.3,-1.2 ccw(c8.8,-1.2) 8.8,-0.7 5.952,-0.7 cw(c5.952,-0.004) 5.256,-0.004 ; 4.558,-0.062 ccw(c5.646,-0.062) 5.646,-1.15 8.806,-1.15 8.85,-3.5 ; 4.712,-3.045 5.413,-3.045 5.678,-3.309 6.719,-4.35 7.449,-5.08 7.67,-5.08 ; 8.625,-3.55 8.8,-3.55 ; 8.8,-3.55 ccw(c8.8,-3.5) 8.85,-3.5 ; 8.8,-3.55 8.85,-3.5
  lines w0.5: 3.495,-2.163 cw(c0,0.75) 0,-3.8 cw(c0,0) -3.8,0 cw(c0,0) 0,3.8 cw(c0,0) 3.8,0 ; 3.867,-2.875 cw(c0,0.75) 0,-4.55 cw(c0,0) -4.55,0 cw(c0,0) 0,4.55 cw(c0,0) 4.55,0 ; 4.617,-3.16 cw(c0,0.75) 0,-5.3 cw(c0,0) -5.3,0 cw(c0,0) 0,5.3 cw(c0,0) 5.3,0
Mid-Layer 14:
  lines w0.15: 7.75,-5.58 cw(c7.75,-5.08) 7.75,-4.58 ; 7.75,-3.04 cw(c7.75,-2.54) 7.75,-2.04 ; 7.75,2.04 cw(c7.75,2.54) 7.75,3.04 ; 7.75,4.58 cw(c7.75,5.08) 7.75,5.58
Bottom Layer:
  region: 6.5,2 7,2.5 8.425,2.5 8.425,1.475 6.5,1.475
  region: 7.71,5.775 7.71,4.405 6.685,4.405 6.685,5.775
  lines w0.25: 3.7,2.059 5.809,2.059 7.3,3.55 8.825,3.55 ; 3.858,0.066 3.858,0.33 cw(c5.128,0.33) 5.128,1.6 6.6,1.6 6.808,1.6 ccw(c6.808,1.998) 7.206,1.998 7.75,2.54 ; 3.867,2.875 4.232,2.509 5.569,2.509 7.059,4 8.8,4 cw(c8.8,3.5) 9.3,3.5 9.3,1.2 cw(c8.8,1.2) 8.8,0.7 5.952,0.7 ccw(c5.952,0.004) 5.256,0.004 ; 4.558,0.062 cw(c5.646,0.062) 5.646,1.15 8.806,1.15 8.85,3.5 ; 4.712,3.045 5.413,3.045 5.678,3.309 6.719,4.35 7.449,5.08 7.67,5.08 ; 8.625,3.55 8.8,3.55 ; 8.8,3.55 cw(c8.8,3.5) 8.85,3.5 ; 8.8,3.55 8.85,3.5
  lines w0.5: 3.495,2.163 ccw(c0,-0.75) 0,3.8 ccw(c0,0) -3.8,0 ccw(c0,0) 0,-3.8 ccw(c0,0) 3.8,0 ; 3.867,2.875 ccw(c0,-0.75) 0,4.55 ccw(c0,0) -4.55,0 ccw(c0,0) 0,-4.55 ccw(c0,0) 4.55,0 ; 4.617,3.16 ccw(c0,-0.75) 0,5.3 ccw(c0,0) -5.3,0 ccw(c0,0) 0,-5.3 ccw(c0,0) 5.3,0
Mechanical 2:
  circle w0.15: c0,0 r3.302
  lines w0.15: 4.942,-3.556 5.32,-3.556 6.141,-4.495 6.141,-5.706 6.141,-5.891 ccw(c6.5,-5.891) 6.5,-6.25 9.75,-6.25 9.75,6.25 7.541,6.25 6.5,6.25 ccw(c6.5,5.891) 6.141,5.891 6.141,5.706 6.141,4.495 5.32,3.556 4.942,3.556 ; 4.942,3.569 ccw(c0,0) -6.096,0 ccw(c0,0) 4.948,-3.56 ; 4.942,3.579 5.32,3.579 6.141,4.518 ; 7.75,6.25 ccw(c7.75,6.25) 7.75,6.25 ; 7.75,6.25 ccw(c7.75,6.25) 7.75,6.25
Top Assembly:
  circle w0.2: c0.002,-0.023 r1.5
  lines w0.2: -5.434,-4.308 -5.493,-4.471 ccw(c-5.023,-4.642) -5.377,-4.996 -1.446,-8.927 1.446,-8.927 5.377,-4.996 ccw(c5.023,-4.642) 5.493,-4.471 5.434,-4.308 ; -5.434,4.308 -5.493,4.471 cw(c-5.023,4.642) -5.377,4.996 -1.446,8.927 1.446,8.927 5.377,4.996 cw(c5.023,4.642) 5.493,4.471 5.434,4.308 ; -4.103,-0.707 ccw(c-5.982,-0.023) -4.103,0.661 -5.49,4.471 cw(c-5.02,4.642) -5.373,4.996 -3.14,7.23 ; -4.103,0.707 cw(c-5.982,0.023) -4.103,-0.661 -5.49,-4.471 ccw(c-5.02,-4.642) -5.373,-4.996 -3.14,-7.23 ; 0,1.477 cw(c-0.002,-0.023) 1.498,-0.023 ; 3.14,-7.23 5.373,-4.996 ccw(c5.02,-4.642) 5.49,-4.471 4.103,-0.661 cw(c5.982,0.023) 4.103,0.707 ; 3.14,7.23 5.373,4.996 cw(c5.02,4.642) 5.49,4.471 4.103,0.661 ccw(c5.982,-0.023) 4.103,-0.707

## RM8 [mm]
pads (12):
  round 2.5 hole 1.2: 1(-10.16,10.16) 2(-10.16,6.35) 3(-10.16,2.54) 4(-10.16,-2.54) 5(-10.16,-6.35) 6(-10.16,-10.16) 7(10.16,-10.16) 8(10.16,-6.35) 9(10.16,-2.54) 10(10.16,2.54) 11(10.16,6.35) 12(10.16,10.16)
Top Overlay:
  lines w0.254: -15,-12.5 15,-12.5 15,11.75 -15,11.75 -15,-12.5
Top Assembly:
  drawing of 1657 lines, arcs and shapes, not listed
3D body "RM8-K-12P-SS-DIL.STEP": height 16.9, standoff -5.7, extent -14.9,-12.33 14.9,11.7

## RM8 mini [mm]
pads (14):
  rect 2x2 hole 1.2 unplated paste-25.4: 1(8.89,6.35)
  round 2 hole 1.2 unplated paste-25.4: 2(8.89,3.81) 3(6.35,3.81) 4(-3.81,-6.35) 5(-3.81,-8.89) 6(-6.35,-8.89) 7(-8.89,-6.35) 8(-8.89,-3.81) 9(-6.35,-3.81) 10(3.81,6.35) 11(3.81,8.89) 12(6.35,8.89)
  round 2.2 hole 1.5 unplated paste-25.4: 13(8.89,-8.89) 14(-8.89,8.89)
Top Overlay:
  lines w0.254: -10.5,-10.5 -10.5,10.5 10.5,10.5 10.5,-10.5 -10.5,-10.5
  text "1" at 9.525,7.874 h1.52
Top Assembly:
  drawing of 1596 lines, arcs and shapes, not listed
3D body "User Library-RM8.STEP": height 16.75, standoff -3.07, extent -10.51,-10.51 10.51,10.512

## RM14 [mm]
pads (12):
  round 3 hole 2: 1(-17.78,13.97) 2(-17.78,8.89) 3(-17.78,3.81) 4(-17.78,-3.81) 5(-17.78,-8.89) 6(-17.78,-13.97) 7(17.78,-13.97) 8(17.78,-8.89) 9(17.78,-3.81) 10(17.78,3.81) 11(17.78,8.89) 12(17.78,13.97)
Top Overlay:
  circle w0.15: c-20,15 r0.453
  lines w0.15: -25,-17 -9.5,-17 -6,-20.5 -3.5,-23 -1,-23 3.5,-23 6,-20.5 9.5,-17 25,-17 25,16.5 9.5,16.5 6,20 3.5,22.5 1,22.5 -3.5,22.5 -6,20 -9.5,16.5 -25,16.5 -25,-17
Top Assembly:
  lines w0.2: -25,-17 -25,16.5 -9.5,16.5 -6,20 -3.5,22.5 1,22.5 3.5,22.5 6,20 9.5,16.5 25,16.5 25,-17 9.5,-17 6,-20.5 3.5,-23 -1,-23 -3.5,-23 -6,-20.5 -9.5,-17 -25,-17
  text "1" at -21,18 h1.52
3D body "RM14 Bobbin.SLDPRT": height 29.5, standoff -4.2, extent -24.24,-15.7 24.24,15.7
3D body "RM14 Core.SLDPRT": height 16, standoff 1, extent -13.935,-21.1 13.935,21.1
3D body "RM14 Core.SLDPRT": height 31, standoff 16, extent -13.935,-21.1 13.935,21.1

## RM14 MINI [mm]
pads (12):
  round 2.5 hole 1.5: 1(16.51,11.43) 2(16.51,6.35) 3(11.43,6.35) 4(11.43,16.51) 5(6.35,16.51) 6(6.35,11.43) 7(-6.35,-11.43) 8(-6.35,-16.51) 9(-11.43,-16.51) 10(-11.43,-6.35) 11(-16.51,-6.35) 12(-16.51,-11.43)
Top Overlay:
  lines w0.15: -18.5,-18.5 -18.5,18.5 18.5,18.5 18.5,-18.5 -18.5,-18.5
Top Assembly:
  lines w0.25: -18.5,-18.5 -18.5,18.5 18.5,18.5 18.5,-18.5 -18.5,-18.5
3D body "RM14-K-12P-TBI.STEP": height 29.67, standoff -1.3, extent -30.017,-30.017 30.017,30.017

## Sonar transformer [mil]
pads (7):
  rect 51.5x51.5 / inner round 47.58 / far side rect 51.5x51.5 hole 31.5: 1(0,98.43) IN1(-88.58,98.43) IN2(88.58,98.43) OUT1(-88.58,-78.74) OUT2(88.58,-78.74)
  rect 59.06x59.06 hole 47.24: SH(-177.17,0) SH(177.17,0)
Top Assembly:
  lines w5: -177.17,-167.32 177.17,-167.32 177.17,187.01 -177.17,187.01 -177.17,-167.32